# Altium footprint library LimeMicroAltiumLib.PcbLib: 760 footprints (part 11 of 50)
Each footprint in its own frame and in the unit in brackets; x right, y up, seen from the top. Pads: shape width x height; smd on the part's side, far side on the other; paste and mask are expansions set on the pad; w line width, h text height; cw(c..) or ccw(c..) is an arc to the next point about the centre after c.
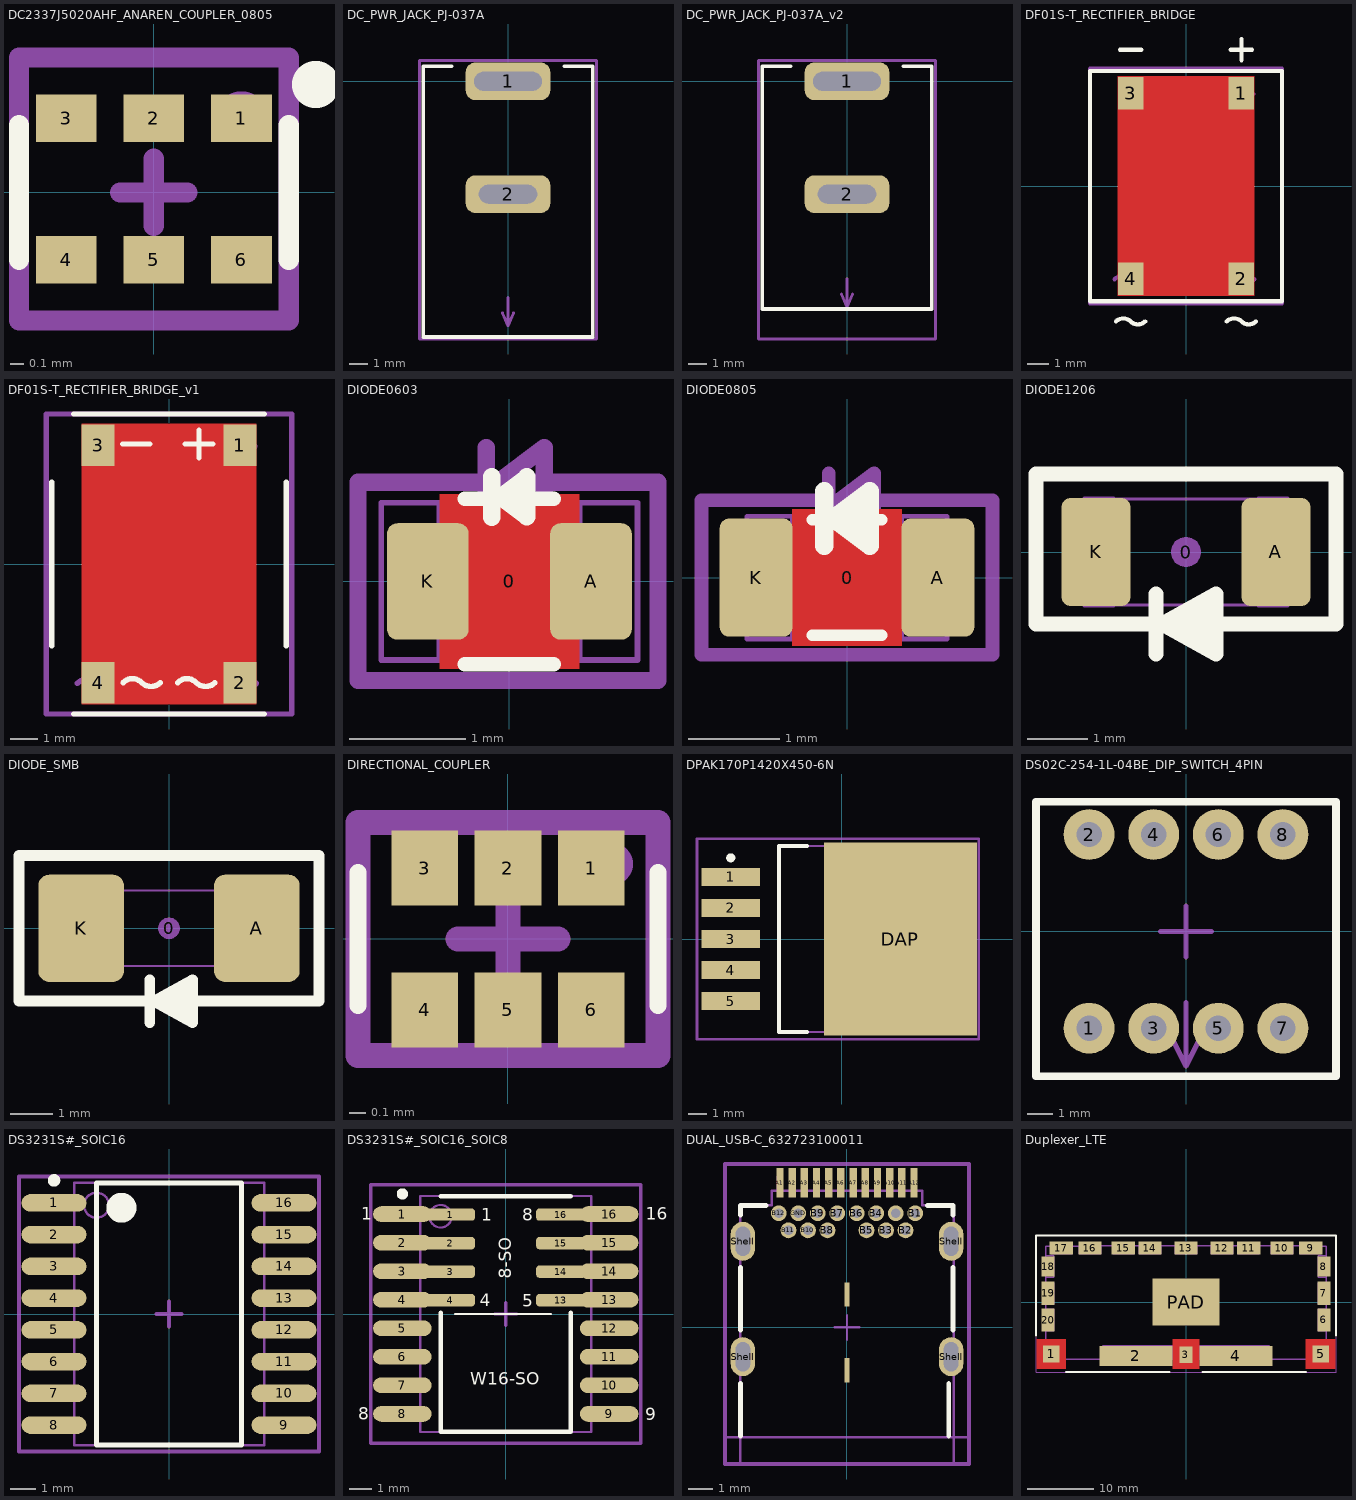
[diagram p10: the footprints below, top view; thin cyan lines are the x and y axes]

## DC2337J5020AHF_ANAREN_COUPLER_0805 [mm]
pads (6):
  rect 0.45x0.35 smd mask+0.05: 1(0.65,0.55) 2(0,0.55) 3(-0.65,0.55) 4(-0.65,-0.5) 5(0,-0.5) 6(0.65,-0.5)
Top Overlay:
  circle w0.3: c1.2,0.8 r0.025
  lines w0.15: -1,-0.5 -1,0.5 ; 1,-0.5 1,0.5
Mechanical 15:
  circle w0.3: c0.65,0.575 r0.025
  lines w0.15: -0.25,0 0.25,0 ; 0,-0.25 0,0.25 ; -1,-0.95 -1,1 1,1 1,-0.95 -1,-0.95
  text ".Designator" at 0,0 h0.55
3D body: height 0.6, standoff 0, extent -1,-0.6 1,0.6
3D body: height 0.6, standoff 0, extent 0.463,-0.075 0.663,0.15

## DC_PWR_JACK_PJ-037A [mm]
pads (2):
  rrect50% 4.5x2 hole 1 slot 3.6 at 0 deg mask+0.05: 1(0,0)
  rrect50% 4.5x2 hole 1 slot 3.1 at 0 deg mask+0.05: 2(0,-6)
Top Overlay:
  lines w0.2: -3,0.8 -4.5,0.8 -4.5,-13.6 4.5,-13.6 4.5,0.8 3,0.8
Mechanical 15:
  lines w0.15: -0.3,-12.3 0,-13 ; 0,-11.5 0,-13 ; 0.3,-12.3 0,-13 ; -4.7,-13.7 4.7,-13.7 4.7,1.1 -4.7,1.1 -4.7,-13.7
  text "board edge" at -2.6,-11.1 h0.55
  text ".Designator" at 0,0 h0.55
3D body "CUI_PJ-037A.step": height 11, standoff -3.5, extent -4.5,-13.7 4.5,0.8

## DC_PWR_JACK_PJ-037A_v2 [mm]
pads (2):
  rrect50% 4.5x2 hole 1 slot 3.6 at 0 deg mask+0.05: 1(0,0)
  rrect50% 4.5x2 hole 1 slot 3.1 at 0 deg mask+0.05: 2(0,-6)
Top Overlay:
  lines w0.2: -3,0.8 -4.5,0.8 -4.5,-12.1 4.5,-12.1 4.5,0.8 3,0.8
Mechanical 15:
  lines w0.15: -0.3,-11.3 0,-12 ; 0,-10.5 0,-12 ; 0.3,-11.3 0,-12 ; -4.7,-13.7 4.7,-13.7 4.7,1.1 -4.7,1.1 -4.7,-13.7
  text "board edge" at -2.6,-10.1 h0.55
  text ".Designator" at 0,0 h0.55
3D body "CUI_PJ-037A.step": height 11, standoff -3.5, extent -4.5,-13.7 4.5,0.8

## DF01S-T_RECTIFIER_BRIDGE [mm]
pads (4):
  rect 1.2x1.52 smd mask+0.05: 1(2.6,4.35) 2(2.6,-4.35) 3(-2.6,4.35) 4(-2.6,-4.35)
Top Layer:
  pour cut-out: -3.2,-5.15 -3.2,5.15 3.2,5.15 3.2,-5.15
Top Overlay:
  lines w0.2: -3.283,-6.35 cw(c-2.941,-6.691) -2.941,-6.209 cw(c-2.941,-6.691) -2.6,-6.35 ccw(c-2.259,-6.009) -2.259,-6.491 ccw(c-2.259,-6.009) -1.917,-6.35 ; -3.1,6.4 -2.1,6.4 ; 1.917,-6.35 cw(c2.259,-6.691) 2.259,-6.209 cw(c2.259,-6.691) 2.6,-6.35 ccw(c2.941,-6.009) 2.941,-6.491 ccw(c2.941,-6.009) 3.283,-6.35 ; 2.1,6.4 3.1,6.4 ; 2.6,5.9 2.6,6.9 ; -4.5,-5.4 4.5,-5.4 4.5,5.4 -4.5,5.4 -4.5,-5.4
Mechanical 15:
  lines w0.2: -3.358,-4.375 cw(c-3.016,-4.716) -3.016,-4.234 cw(c-3.016,-4.716) -2.675,-4.375 ccw(c-2.334,-4.034) -2.334,-4.516 ccw(c-2.334,-4.034) -1.992,-4.375 ; -3.05,4.325 -2.05,4.325 ; -1,0 1,0 ; 0,-1 0,1 ; 1.842,-4.375 cw(c2.184,-4.716) 2.184,-4.234 cw(c2.184,-4.716) 2.525,-4.375 ccw(c2.866,-4.034) 2.866,-4.516 ccw(c2.866,-4.034) 3.208,-4.375 ; 2.15,4.325 3.15,4.325 ; 2.65,3.825 2.65,4.825 ; -4.5,-5.5 -4.5,5.5 4.5,5.5 4.5,-5.5 -4.5,-5.5
  text ".Designator" at 0,0 h0.55
3D body "User Library-DFXXS.step": height 3.6, standoff 0.03, extent -4.255,-5.15 4.255,5.15

## DF01S-T_RECTIFIER_BRIDGE_v1 [mm]
pads (4):
  rect 1.2x1.52 smd mask+0.05: 1(2.6,4.35) 2(2.6,-4.35) 3(-2.6,4.35) 4(-2.6,-4.35)
Top Layer:
  pour cut-out: -3.2,-5.15 -3.2,5.15 3.2,5.15 3.2,-5.15
Top Overlay:
  lines w0.2: -4.3,-3 -4.3,3 ; -3.5,-5.5 3.5,-5.5 ; -3.5,5.5 3.5,5.5 ; -1.7,4.4 -0.7,4.4 ; -1.683,-4.35 cw(c-1.341,-4.691) -1.341,-4.209 cw(c-1.341,-4.691) -1,-4.35 ccw(c-0.659,-4.009) -0.659,-4.491 ccw(c-0.659,-4.009) -0.317,-4.35 ; 0.317,-4.35 cw(c0.659,-4.691) 0.659,-4.209 cw(c0.659,-4.691) 1,-4.35 ccw(c1.341,-4.009) 1.341,-4.491 ccw(c1.341,-4.009) 1.683,-4.35 ; 0.6,4.4 1.6,4.4 ; 1.1,3.9 1.1,4.9 ; 4.3,-3 4.3,3
Mechanical 15:
  lines w0.2: -3.358,-4.375 cw(c-3.016,-4.716) -3.016,-4.234 cw(c-3.016,-4.716) -2.675,-4.375 ccw(c-2.334,-4.034) -2.334,-4.516 ccw(c-2.334,-4.034) -1.992,-4.375 ; -3.05,4.325 -2.05,4.325 ; -1,0 1,0 ; 0,-1 0,1 ; 1.842,-4.375 cw(c2.184,-4.716) 2.184,-4.234 cw(c2.184,-4.716) 2.525,-4.375 ccw(c2.866,-4.034) 2.866,-4.516 ccw(c2.866,-4.034) 3.208,-4.375 ; 2.15,4.325 3.15,4.325 ; 2.65,3.825 2.65,4.825 ; -4.5,-5.5 -4.5,5.5 4.5,5.5 4.5,-5.5 -4.5,-5.5
  text ".Designator" at 0,0 h0.55
3D body "User Library-DFXXS.step": height 3.6, standoff 0.03, extent -4.255,-5.15 4.255,5.15

## DIODE0603 [mm]
height 0.7
pads (3):
  round 0.254 on Mech15: 0(0,0)
  rrect25% 0.7x1 smd: A(0.7,0) K(-0.7,0)
Top Layer:
  pour cut-out: -0.6,0.75 0.6,0.75 0.6,-0.75 -0.6,-0.75
Top Overlay:
  lines w0.127: -0.381,-0.71 0.381,-0.71 ; -0.381,0.71 0.381,0.71
  lines w0.15: -0.15,0.55 -0.15,0.9 ; 0.15,0.894 -0.075,0.725 0.15,0.556 0.15,0.897
Mechanical 13:
  lines w0.05: 0.6,-0.674 -0.6,-0.674 ; -0.6,-0.674 0.6,-0.674 ; -0.6,-0.675 -1.1,-0.675 -1.1,0.675 -0.6,0.675 -0.6,-0.675 ; 0.6,-0.675 1.1,-0.675 1.1,0.675 0.6,0.675 ; 0.6,-0.675 0.6,0.675 ; 0.6,0.674 -0.6,0.674 0.6,0.674
Mechanical 15:
  lines w0.15: -0.2,0.55 -0.2,1.15 ; -0.1,0.85 0.3,0.55 0.3,1.15 ; -0.1,0.85 0.3,1.15 ; -0.1,0.85 0.3,0.85 0.3,1.15 ; -1.3,-0.85 -1.3,0.85 1.275,0.85 1.275,-0.85 -1.3,-0.85
  text "C" at -1.05,-0.4 h0.55
  text "A" at 0.5,-0.375 h0.55
  text ".Designator" at 0,0 h0.55
3D body "RES 0805 (2012 metric).STEP": height 0.69, standoff -0.01, extent -1.1,-0.675 1.1,0.675

## DIODE0805 [mm] "Chip Resistor, Body 2.0x1.2mm, 0805, IPC Medium Density"
height 0.7
pads (3):
  round 0.254 on Mech15: 0(0,0)
  rrect25% 0.8x1.3 smd: A(1,0) K(-1,0)
Top Layer:
  pour cut-out: -0.6,0.75 0.6,0.75 0.6,-0.75 -0.6,-0.75
Top Overlay:
  lines w0.127: -0.381,-0.635 0.381,-0.635 ; -0.381,0.635 0.381,0.635
  lines w0.2: -0.25,0.35 -0.25,0.95 ; -0.15,0.65 0.25,0.35 0.25,0.95 ; -0.15,0.65 0.25,0.95 ; -0.15,0.65 0.25,0.65 0.25,0.95
Mechanical 13:
  lines w0.05: 0.6,-0.674 -0.6,-0.674 ; -0.6,-0.675 -0.6,0.675 -1.1,0.675 -1.1,-0.675 -0.6,-0.675 ; -0.6,-0.674 0.6,-0.674 ; 0.6,-0.675 0.6,0.675 ; 0.6,-0.675 1.1,-0.675 1.1,0.675 0.6,0.675 ; 0.6,0.674 -0.6,0.674 0.6,0.674
Mechanical 15:
  lines w0.15: -0.2,0.55 -0.2,1.15 ; -0.1,0.85 0.3,0.85 0.3,1.15 ; -0.1,0.85 0.3,1.15 ; -0.1,0.85 0.3,0.55 0.3,1.15 ; -1.6,-0.85 1.6,-0.85 1.6,0.85 -1.6,0.85 -1.6,-0.85
  text ".Designator" at 0,0 h0.55
  text "A" at 0.7,-0.3 h0.55
  text "C" at -1.275,-0.3 h0.55
3D body "RES 0805 (2012 metric).STEP": height 0.69, standoff -0.01, extent -1.1,-0.675 1.1,0.675

## DIODE1206 [mm]
height 1.6
pads (3):
  round 0.508 on Mech15: 0(0,0)
  rrect25% 1.15x1.8 smd: A(1.5,0) K(-1.5,0)
Top Overlay:
  lines w0.254: -0.5,-1.7 -0.5,-0.7 ; 0,-1.4 0.5,-1.4 ; 0.1,-1 0.5,-1 ; 0.5,-1.2 0.3,-1.2 -0.4,-1.2 ; -0.4,-1.2 0.5,-0.7 0.5,-1.7 -0.4,-1.2 ; -2.5,-1.2 2.5,-1.2 2.5,1.3 -2.5,1.3 -2.5,-1.2
Mechanical 13:
  lines w0.05: -1.2,-0.88 1.2,-0.88 ; -1.2,0.88 1.2,0.88 ; -1.7,-0.9 -1.2,-0.9 -1.2,0.9 -1.7,0.9 -1.7,-0.9 ; 1.2,-0.9 1.7,-0.9 1.7,0.9 1.2,0.9 1.2,-0.9
Mechanical 15:
  lines w0.15: -0.5,-1.7 -0.5,-0.7 ; 0,-1.4 0.5,-1.4 ; 0.1,-1 0.5,-1 ; 0.5,-1.2 0.3,-1.2 -0.4,-1.2 ; -0.4,-1.2 0.5,-1.7 0.5,-0.7 -0.4,-1.2 ; -2.5,-1.2 -2.5,1.3 2.5,1.3 2.5,-1.2 -2.5,-1.2
  text ".Designator" at 0,0 h0.55
3D body "CAP_1206.STEP": height 1.74, standoff -0.01, extent -1.7,-0.9 1.7,0.9

## DIODE_SMB [mm]
height 1.6
pads (3):
  round 0.508 on Mech15: 0(0,0)
  rrect25% 2x2.5 smd: A(2.05,0) K(-2.05,0)
Top Overlay:
  lines w0.254: -0.45,-2.2 -0.45,-1.2 ; 0.05,-1.9 0.55,-1.9 ; 0.15,-1.5 0.55,-1.5 ; 0.55,-1.7 0.35,-1.7 -0.35,-1.7 ; -0.35,-1.7 0.55,-2.2 0.55,-1.2 -0.35,-1.7 ; -3.5,-1.7 -3.5,1.7 3.5,1.7 3.5,-1.7 -3.5,-1.7
Mechanical 13:
  lines w0.05: -1.2,-0.88 1.2,-0.88 ; -1.2,0.88 1.2,0.88 ; -1.7,-0.9 -1.7,0.9 -1.2,0.9 -1.2,-0.9 -1.7,-0.9 ; 1.2,-0.9 1.2,0.9 1.7,0.9 1.7,-0.9 1.2,-0.9
Mechanical 15:
  lines w0.15: -0.45,-2.2 -0.45,-1.2 ; 0.05,-1.9 0.55,-1.9 ; 0.15,-1.5 0.55,-1.5 ; 0.55,-1.7 0.35,-1.7 -0.35,-1.7 ; -0.35,-1.7 0.55,-1.2 0.55,-2.2 -0.35,-1.7 ; -3.5,-1.7 3.5,-1.7 3.5,1.7 -3.5,1.7 -3.5,-1.7
  text "A" at 1.7,-0.5 h0.55
  text "C" at -2.2,-0.5 h0.55
  text ".Designator" at 0,0 h0.55
3D body "DO-214AA.STEP": height 2.62, standoff 0, extent -2.7,-2 2.9,1.95

## DIRECTIONAL_COUPLER [mm]
height 0.7
pads (6):
  rect 0.4x0.45 smd mask+0.05: 1(0.5,0.425) 2(0,0.425) 3(-0.5,0.425) 4(-0.5,-0.425) 5(0,-0.425) 6(0.5,-0.425)
Top Overlay:
  lines w0.1: -0.9,-0.4 -0.9,0.4 ; 0.9,-0.4 0.9,0.4
Top Solder:
  region: -0.75,-0.15 0.75,-0.15 0.75,-0.7 -0.75,-0.7
  region: -0.75,0.7 0.75,0.7 0.75,0.15 -0.75,0.15
Mechanical 15:
  circle w0.2: c0.625,0.45 r0.025
  lines w0.15: -0.3,0 0.3,0 ; 0,-0.3 0,0.3 ; -0.9,-0.7 -0.9,0.7 0.9,0.7 0.9,-0.7 -0.9,-0.7
  text ".Designator" at 0,0 h0.55
3D body: height 0.6, standoff 0, extent -0.65,0.275 -0.35,0.425
3D body: height 0.6, standoff 0, extent -0.15,0.275 0.15,0.425
3D body: height 0.6, standoff 0, extent 0.35,0.275 0.65,0.425
3D body: height 0.6, standoff 0, extent 0.35,-0.425 0.65,-0.275
3D body: height 0.6, standoff 0, extent -0.15,-0.425 0.15,-0.275
3D body: height 0.6, standoff 0, extent -0.65,-0.425 -0.35,-0.275
3D body: height 0.6, standoff 0, extent 0.463,-0.075 0.663,0.15
3D body: height 0.6, standoff 0, extent -0.8,-0.4 0.8,0.4

## DPAK170P1420X450-6N [mm] "D2-PAK, 6-Pads, Body 7,75x8,46mm (max), IPC Medium Density"
height 4.5
pads (6):
  rect 3.2x1 smd: 1(-6.1,3.4) 2(-6.1,1.7) 3(-6.1,0) 4(-6.1,-1.7) 5(-6.1,-3.4)
  rect 8.38x10.6 smd: DAP(3.2,0)
Top Overlay:
  circle w0.25: c-6.1,4.45 r0.125
  lines w0.2: -1.9,-5.1 -3.45,-5.1 -3.45,5.1 -1.9,5.1
Mechanical 13:
  lines w0.1: -3.45,-5.1 5.85,-5.1 5.85,5.1 -3.45,5.1 -3.45,-5.1
Mechanical 15:
  circle w0.35: c-6.225,3.425 r0.103
  lines w0.15: -0.5,0 0.5,0 ; 0,-0.5 0,0.5 ; -7.95,-5.5 7.5,-5.5 7.5,5.5 -7.95,5.5 -7.95,-5.5
  text ".Designator" at 0,0 h0.55
3D body: height 4.5, standoff 0, extent -3.45,-5.1 5.85,5.1

## DS02C-254-1L-04BE_DIP_SWITCH_4PIN [mm]
pads (8):
  round 2 hole 1 mask+0.05: 1(-3.81,-3.81) 2(-3.81,3.81) 3(-1.27,-3.81) 4(-1.27,3.81) 5(1.27,-3.81) 6(1.27,3.81) 7(3.81,-3.81) 8(3.81,3.81)
Top Overlay:
  lines w0.3: -5.9,-5.7 -5.9,5.1 5.9,5.1 5.9,-5.7 -5.9,-5.7
Mechanical 15:
  lines w0.2: -1,0 0,0 ; -0.5,-4.3 0,-5.3 ; 0,-2.8 0,-5.3 ; 0,-1 0,0 ; 0,1 0,0 ; 0.5,-4.3 0,-5.3 ; 1,0 0,0 ; -5.9,-5.7 -5.9,5.1 5.9,5.1 5.9,-5.7 -5.9,-5.7
  text "2" at -3.9,3.6 h0.55
  text "1" at -3.9,-4 h0.55
  text "Board edge" at -2.3,-2.4 h0.55
  text ".Designator" at 0,0 h0.55
3D body "CUI_DEVICES_DS02C-254-1L-04BE.step": height 9.46, standoff -3.8, extent -5.865,-7.8 5.865,5.08

## DS3231S#_SOIC16 [mm] "SOIC, 16-Leads, Body 10.3x7.5mm, Pitch 1.27mm, IPC Low Density"
height 2.65
pads (16):
  oval 2.6x0.7 smd: 1(-4.6,4.445) 2(-4.6,3.175) 3(-4.6,1.905) 4(-4.6,0.635) 5(-4.6,-0.635) 6(-4.6,-1.905) 7(-4.6,-3.175) 8(-4.6,-4.445) 9(4.6,-4.445) 10(4.6,-3.175) 11(4.6,-1.905) 12(4.6,-0.635) 13(4.6,0.635) 14(4.6,1.905) 15(4.6,3.175) 16(4.6,4.445)
Top Overlay:
  circle w0.25: c-4.6,5.345 r0.125
  circle w0.6: c-1.9,4.25 r0.3
  lines w0.2: -2.9,-5.25 -2.9,5.25 2.9,5.25 2.9,-5.25 -2.9,-5.25
Mechanical 13:
  circle w0.1: c-2.9,4.35 r0.5
  lines w0.1: -3.8,-5.25 -3.8,5.25 3.8,5.25 3.8,-5.25 -3.8,-5.25
Mechanical 15:
  circle w0.25: c-4.6,4.4 r0.1
  lines w0.15: -0.5,0 0.5,0 ; 0,-0.5 0,0.5 ; -6,-5.5 -6,5.5 6,5.5 6,-5.5 -6,-5.5
  text ".Designator" at 0,0 h0.55
3D body "User Library-SOIC16-300.step": height 2.65, standoff 0, extent -5.15,-5.15 5.15,5.15

## DS3231S#_SOIC16_SOIC8 [mm] "SOIC, 16-Leads, Body 10.3x7.5mm, Pitch 1.27mm, IPC Low Density"
height 2.65
pads (24):
  oval 2.6x0.7 smd: 1(-4.6,4.445) 2(-4.6,3.175) 3(-4.6,1.905) 4(-4.6,0.635) 5(-4.6,-0.635) 6(-4.6,-1.905) 7(-4.6,-3.175) 8(-4.6,-4.445) 9(4.6,-4.445) 10(4.6,-3.175) 11(4.6,-1.905) 12(4.6,-0.635) 13(4.6,0.635) 14(4.6,1.905) 15(4.6,3.175) 16(4.6,4.445)
  rrect50% 2.2x0.55 smd mask+0.05: 1(-2.475,4.425) 2(-2.475,3.155) 3(-2.475,1.885) 4(-2.475,0.615) 13(2.455,0.615) 14(2.455,1.885) 15(2.455,3.155) 16(2.455,4.425)
Top Overlay:
  circle w0.25: c-4.6,5.345 r0.125
  lines w0.1: -2.25,0 2,0
  lines w0.2: -2.9,0.05 -2.9,-5.25 2.9,-5.25 2.9,0.05 ; -2.9,5.25 2.9,5.25
  text "5" at 0.725,0.325 h0.55
  text "4" at -1.15,0.35 h0.55
  text "8" at 0.725,4.15 h0.55
  text "16" at 6.225,4.2 h0.55
  text "9" at 6.2,-4.725 h0.55
  text "8" at -6.575,-4.7 h0.55
  text "1" at -1.1,4.15 h0.55
  text "1" at -6.425,4.2 h0.55
  text "W16-SO" at -1.575,-3.15 h0.55
  text "8-SO" at 0.25,1.575 h0.55
Mechanical 13:
  circle w0.1: c-2.9,4.35 r0.5
  lines w0.1: -3.8,-5.25 -3.8,5.25 3.8,5.25 3.8,-5.25 -3.8,-5.25
Mechanical 15:
  circle w0.25: c-4.6,4.4 r0.1
  lines w0.15: -0.5,0 0.5,0 ; 0,-0.5 0,0.5 ; -6,-5.75 -6,5.75 6,5.75 6,-5.75 -6,-5.75
  text ".Designator" at 0,0 h0.55
3D body "User Library-SOIC16-300.step": height 2.65, standoff 0, extent -5.15,-5.15 5.15,5.15

## DUAL_USB-C_632723100011 [mm]
pads (32):
  rect 0.3x1.2 smd mask+0.05: A1(-2.75,5.93) A2(-2.25,5.93) A3(-1.75,5.93) A4(-1.25,5.93) A5(-0.75,5.93) A6(-0.25,5.93) A7(0.25,5.93) A8(0.75,5.93) A9(1.25,5.93) A10(1.75,5.93) A11(2.25,5.93) A12(2.75,5.93)
  round 0.65 hole 0.4 mask+0.05: B1(2.8,4.68) B2(2.4,3.98) B3(1.6,3.98) B4(1.2,4.68) B5(0.8,3.98) B6(0.4,4.68) B7(-0.4,4.68) B8(-0.8,3.98) B9(-1.2,4.68) B10(-1.6,3.98) B11(-2.4,3.98) B12(-2.8,4.68) GND(-2,4.68) GND1(2,4.68)
  oval 1x1.6 hole 0.6 slot 1.2 at 90 deg mask+0.05: Shell(-4.27,-1.2) Shell(-4.27,3.53) Shell(4.27,-1.2) Shell(4.27,3.53)
  rect 0.2x1 smd mask+0.05: Shell(0,-1.75) Shell(0,1.35)
Top Overlay:
  lines w0.2: -4.37,-4.45 -4.37,-2.3 ; -4.37,-0.1 -4.37,2.45 ; -4.37,4.6 -4.37,5 -3.32,5 ; 3.29,5 4.34,5 4.34,4.6 ; 4.17,-4.45 4.17,-2.3 ; 4.34,-0.1 4.34,2.45
Mechanical 13:
  lines w0.05: -2.85,5.6 -2.85,6.19 -2.65,6.19 -2.65,5.6 ; -2.35,5.6 -2.35,6.19 -2.15,6.19 -2.15,5.6 ; -1.85,5.6 -1.85,6.19 -1.65,6.19 -1.65,5.6 ; -1.35,5.6 -1.35,6.19 -1.15,6.19 -1.15,5.6 ; -0.85,5.6 -0.85,6.19 -0.65,6.19 -0.65,5.6 ; -0.35,5.6 -0.35,6.19 -0.15,6.19 -0.15,5.6 ; 0.15,5.6 0.15,6.19 0.35,6.19 0.35,5.6 ; 0.65,5.6 0.65,6.19 0.85,6.19 0.85,5.6 ; 1.15,5.6 1.15,6.19 1.35,6.19 1.35,5.6 ; 1.65,5.6 1.65,6.19 1.85,6.19 1.85,5.6 ; 2.15,5.6 2.15,6.19 2.35,6.19 2.35,5.6 ; 2.65,5.6 2.65,6.19 2.85,6.19 2.85,5.6
  lines w0.1: 4.34,-5.6 -4.37,-5.6 -4.37,5 -3.08,5 -3.08,5.6 3.08,5.6 3.08,5 4.37,5 4.37,-5.6
Mechanical 15:
  lines w0.1: -5,-4.5 5,-4.5 ; -0.5,0 0.5,0 ; 0,-0.5 0,0.5
  lines w0.15: -5,-5.6 -5,6.7 5,6.7 5,-5.6 -5,-5.6
  text ".Designator" at 0,0 h0.55
  text "PCB edge" at -2.2,-4.1 h0.55
  text "A1" at -3.4,5.6 h0.55
  text "A12" at 2.7,5.6 h0.55
3D body "632723100011.stp": height 3.05, standoff -1.81, extent -4.37,-5.6 4.37,6.194

## Duplexer_LTE [mm] "Ceramic duplexer for LTE bands"
pads (21):
  rect 2.5x2.5 smd mask+0.05: 1(-20.2,-7.8) 5(20.2,-7.8)
  rect 11x3 smd mask+0.05: 2(-7.5,-8.1) 4(7.5,-8.1)
  rect 2x2.5 smd mask+0.05: 3(0,-7.9)
  rect 2x3.5 smd mask+0.05: 6(20.7,-2.7) 7(20.7,1.3) 19(-20.7,1.3) 20(-20.7,-2.7)
  rect 2x3 smd mask+0.05: 8(20.7,5.3) 18(-20.7,5.3)
  rect 3.5x2 smd mask+0.05: 9(18.7,8.1) 10(14.4,8.1) 11(9.4,8.1) 12(5.4,8.1) 13(0,8.1) 14(-5.4,8.1) 15(-9.4,8.1) 16(-14.4,8.1) 17(-18.7,8.1)
  rect 10x7 smd mask+0.05: PAD(0,0)
Top Layer:
  pour cut-out: -22.4,-10 -22.4,-5.6 -18,-5.6 -18,-10
  pour cut-out: -2,-10 -2,-5.6 2,-5.6 2,-10
  pour cut-out: 18,-10 18,-5.6 22.4,-5.6 22.4,-10
Top Overlay:
  lines w0.3: -22.5,-5 -22.5,10 22.5,10 22.5,-5 ; -18,-10.5 -2.5,-10.5 ; 2.5,-10.5 18,-10.5
Mechanical 13:
  lines w0.2: -21,-6.6 -19,-6.6 -19,-8.6 ; -21,-4.3 -19.8,-4.3 -19.8,-1.1 -21,-1.1 ; -21,-0.3 -19.8,-0.3 -19.8,2.9 -21,2.9 ; -21,3.7 -19.8,3.7 -19.8,6.9 -21,6.9 ; -20.3,8.4 -20.3,7.2 -17.1,7.2 -17.1,8.4 ; -16,8.4 -16,7.2 -12.8,7.2 -12.8,8.4 ; -11,8.4 -11,7.2 -7.8,7.2 -7.8,8.4 ; -7,8.4 -7,7.2 -3.8,7.2 -3.8,8.4 ; -1.6,8.4 -1.6,7.2 1.6,7.2 1.6,8.4 ; 3.8,8.4 3.8,7.2 7,7.2 7,8.4 ; 7.8,8.4 7.8,7.2 11,7.2 11,8.4 ; 12.8,8.4 12.8,7.2 16,7.2 16,8.4 ; 17.1,8.4 17.1,7.2 20.3,7.2 20.3,8.4 ; 19,-8.6 19,-6.6 21,-6.6 ; 21,-4.3 19.8,-4.3 19.8,-1.1 21,-1.1 ; 21,-0.3 19.8,-0.3 19.8,2.9 21,2.9 ; 21,3.7 19.8,3.7 19.8,6.9 21,6.9 ; -15.107,8.4 ccw(c-14.4,8.4) -13.693,8.4 -10.107,8.4 ccw(c-9.4,8.4) -8.693,8.4 -6.107,8.4 ccw(c-5.4,8.4) -4.693,8.4 -0.707,8.4 ccw(c0,8.4) 0.707,8.4 4.693,8.4 ccw(c5.4,8.4) 6.107,8.4 8.693,8.4 ccw(c9.4,8.4) 10.107,8.4 13.693,8.4 ccw(c14.4,8.4) 15.107,8.4 17.993,8.4 ; -15.107,8.4 -15.107,8.4 ; -15.107,8.4 -17.993,8.4 cw(c-18.7,8.4) -19.407,8.4 -21,8.4 -21,6.007 cw(c-21,5.3) -21,4.593 -21,2.007 cw(c-21,1.3) -21,0.593 -21,-1.993 cw(c-21,-2.7) -21,-3.407 -21,-8.6 -12.5,-8.6 ; -12.5,-8.6 -10.207,-8.6 ; -12.5,-8.6 -12.5,-6.6 -2,-6.6 -2,-8.6 ; -10.207,-8.6 cw(c-9.5,-8.6) -8.793,-8.6 -6.207,-8.6 cw(c-5.5,-8.6) -4.793,-8.6 -2,-8.6 ; -10.207,-8.6 -10.207,-8.6 ; -2,-8.6 -2,-8.6 ; 2,-8.6 4.793,-8.6 cw(c5.5,-8.6) 6.207,-8.6 8.793,-8.6 cw(c9.5,-8.6) 10.207,-8.6 ; 2,-8.6 2,-8.6 ; 2,-8.6 2,-6.6 12.5,-6.6 12.5,-8.6 ; 10.207,-8.6 12.5,-8.6 ; 10.207,-8.6 10.207,-8.6 ; 12.5,-8.6 21,-8.6 21,-3.407 cw(c21,-2.7) 21,-1.993 21,0.593 cw(c21,1.3) 21,2.007 21,4.593 cw(c21,5.3) 21,6.007 21,8.4 19.407,8.4 cw(c18.7,8.4) 17.993,8.4 ; 17.993,8.4 17.993,8.4 ; -1,-8.6 -1,-6.6 1,-6.6 1,-8.6 -1,-8.6
Mechanical 15:
  lines w0.15: -1.5,0 1.5,0 ; 0,-1.5 0,1.5 ; -22.5,-10.5 -22.5,10 22.5,10 22.5,-10.5 -22.5,-10.5
  text ".Designator" at 0,0 h0.55
  text "I/O port" at -21.5,-8 h0.55
  text "I/O port" at 17.5,-8 h0.55
  text "ANTENNA" at -2,-8 h0.55
3D body: height 9.5, standoff 0, extent -21,-8.6 21,8.4